# Altium footprint library LAN Transformer.PcbLib: 66 footprints (part 4 of 5)
Each footprint in its own frame and in the unit in brackets; x right, y up, seen from the top. Pads: shape width x height; smd on the part's side, far side on the other; paste and mask are expansions set on the pad; w line width, h text height; cw(c..) or ccw(c..) is an arc to the next point about the centre after c.
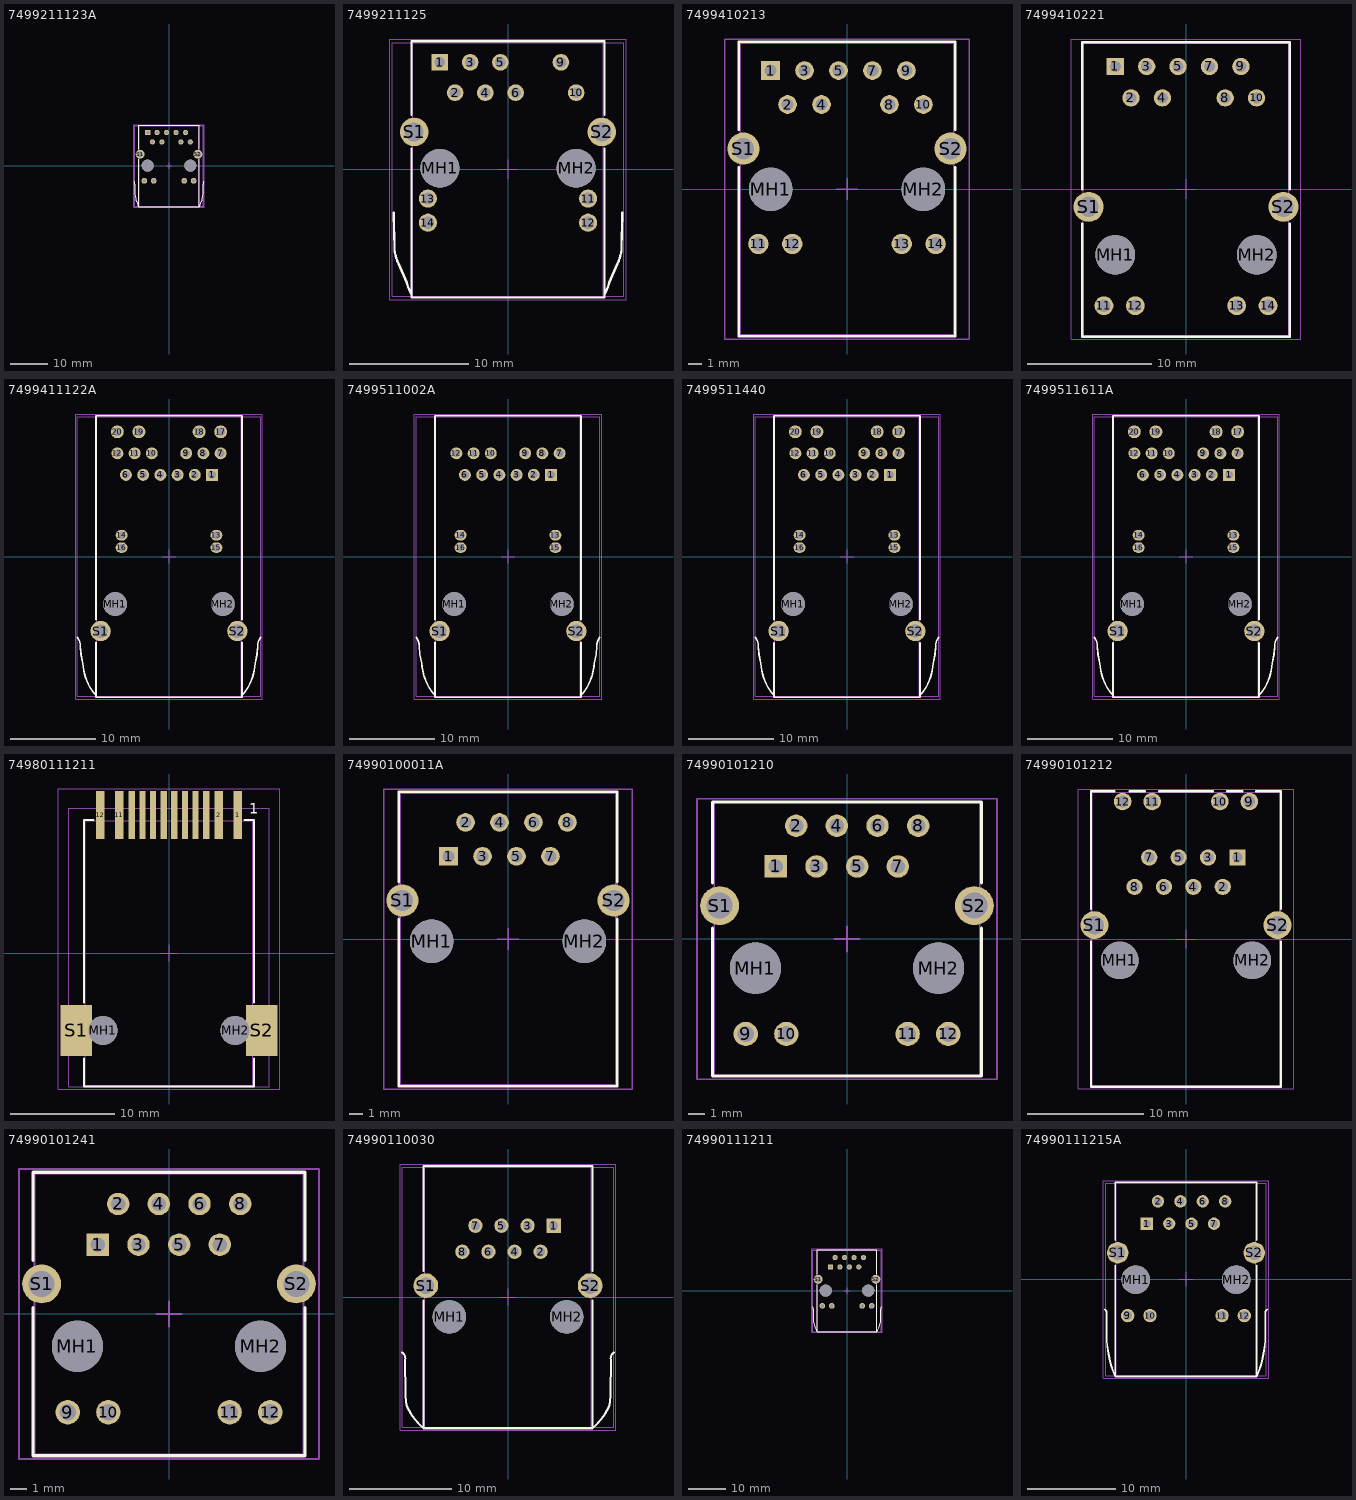
[diagram p3: the footprints below, top view; thin cyan lines are the x and y axes]

## 7499211123A [mm] "LAN Transformer, body 21.6x16mm"
height 13.95
pads (17):
  rect 1.4x1.4 hole 0.9: 1(-5.715,8.98)
  round 1.4 hole 0.9: 2(-4.445,6.44) 3(-3.175,8.98) 4(-1.905,6.44) 5(-0.635,8.98) 7(1.905,8.98) 8(3.175,6.44) 9(4.445,8.98) 10(5.715,6.44)
  round 1.52 hole 1.02: 11(-6.63,-3.97) 12(-4.09,-3.97) 13(4.09,-3.97) 14(6.63,-3.97)
  round 3.25 hole 3.25 unplated: MH1(-5.715,0.09) MH2(5.715,0.09)
  round 2.4 hole 1.6: S1(-7.745,3.14) S2(7.745,3.14)
Top Overlay:
  lines w0.2: -9.269,-4.203 cw(c-10.38,-4.815) -9.113,-4.872 ccw(c-5.498,-5.312) -9.14,-5.342 ccw(c15.524,-6.17) -9.069,-8.214 ccw(c-0.65,-6.695) -8.1,-10.9 ; -8.1,1.74 -8.1,-10.9 ; -8.1,4.55 -8.1,10.9 8.1,10.9 8.1,4.55 ; 8.1,1.74 8.1,-10.9 ; 9.269,-4.203 ccw(c10.38,-4.815) 9.113,-4.872 cw(c5.498,-5.312) 9.14,-5.342 cw(c-15.524,-6.17) 9.069,-8.214 cw(c0.65,-6.695) 8.1,-10.9 ; -8.1,-10.9 8.1,-10.9
Mechanical 11:
  lines w0.1: -8,-10.8 -8,10.8 8,10.8 8,-10.8 -8,-10.8
  text ".Designator" at 0,0 h1
Mechanical 13:
  lines w0.1: -9.223,-10.8 9.223,-10.8 9.223,10.8 -9.223,10.8 -9.223,-10.8
Mechanical 15:
  lines w0.1: -0.8,0 0.8,0 ; 0,-0.8 0,0.8 ; -9.47,-11.1 -9.47,11.1 9.47,11.1 9.47,-11.1 -9.47,-11.1
3D body "7499211123A.stp": height 15.27, standoff -3.6, extent -9.223,-10.8 9.223,10.8

## 7499211125 [mm] "LAN Transformer, body 21.3x16mm"
height 13.55
pads (16):
  rect 1.4x1.4 hole 0.89: 1(-5.715,8.99)
  round 1.4 hole 0.89: 2(-4.445,6.45) 3(-3.175,8.99) 4(-1.905,6.45) 5(-0.635,8.99) 6(0.635,6.45) 9(4.445,8.99) 10(5.715,6.45)
  round 1.52 hole 1.02: 11(6.725,-2.44) 12(6.725,-4.47) 13(-6.725,-2.44) 14(-6.725,-4.47)
  round 3.25 hole 3.25 unplated: MH1(-5.715,0.1) MH2(5.715,0.1)
  round 2.4 hole 1.6: S1(-7.875,3.15) S2(7.875,3.15)
Top Overlay:
  lines w0.2: -9.588,-3.63 -9.53,-6.73 ccw(c-8.26,-6.73) -9.43,-7.224 ccw(c-6.96,-6.73) -9.172,-7.935 -8.505,-9.494 ccw(c-2.16,-7.61) -8.1,-10.53 ; -8.1,1.73 -8.1,-10.75 8.1,-10.75 8.1,1.73 ; -8.1,4.57 -8.1,10.75 8.1,10.75 8.1,4.57 ; 8.1,-10.53 ccw(c2.16,-7.61) 8.505,-9.494 9.172,-7.935 ccw(c6.96,-6.73) 9.43,-7.224 ccw(c8.26,-6.73) 9.53,-6.73 9.588,-3.63
Mechanical 11:
  lines w0.1: -8,-10.65 -8,10.65 8,10.65 8,-10.65 -8,-10.65
  text ".Designator" at 0,0 h1
Mechanical 13:
  lines w0.1: -9.724,-10.65 9.724,-10.65 9.724,10.65 -9.724,10.65 -9.724,-10.65
Mechanical 15:
  lines w0.1: -0.8,0 0.8,0 ; 0,-0.8 0,0.8 ; -9.924,-10.95 -9.924,10.95 9.924,10.95 9.924,-10.95 -9.924,-10.95
3D body "7499211125.stp": height 15.3, standoff -3.35, extent -9.724,-10.65 9.724,10.65

## 7499410213 [mm] "LAN Transformer, body 21.84x16mm"
height 13.74
pads (17):
  rect 1.4x1.4 hole 0.9: 1(-5.715,8.86)
  round 1.4 hole 0.9: 2(-4.445,6.32) 3(-3.175,8.86) 4(-1.905,6.32) 5(-0.635,8.86) 7(1.905,8.86) 8(3.175,6.32) 9(4.445,8.86) 10(5.715,6.32)
  round 1.52 hole 1.02: 11(-6.63,-4.11) 12(-4.09,-4.11) 13(4.09,-4.11) 14(6.63,-4.11)
  round 3.25 hole 3.25 unplated: MH1(-5.715,-0.03) MH2(5.715,-0.03)
  round 2.4 hole 1.6: S1(-7.745,3.02) S2(7.745,3.02)
Top Overlay:
  lines w0.2: -8.1,1.61 -8.1,-11.02 8.1,-11.02 8.1,1.61 ; -8.1,4.43 -8.1,11.02 8.1,11.02 8.1,4.43
Mechanical 11:
  lines w0.1: -8,-10.92 -8,10.92 8,10.92 8,-10.92 -8,-10.92
  text ".Designator" at 0,0 h1
Mechanical 13:
  lines w0.1: -8,-10.92 8,-10.92 8,10.92 -8,10.92 -8,-10.92
Mechanical 15:
  lines w0.1: -0.8,0 0.8,0 ; 0,-0.8 0,0.8 ; -9.145,-11.22 -9.145,11.22 9.145,11.22 9.145,-11.22 -9.145,-11.22
3D body "7499410213.stp": height 13.92, standoff -3.25, extent -8,-10.92 8,10.92

## 7499410221 [mm] "LAN Transformer, body 23.6x16.6mm"
height 17.1
pads (17):
  rect 1.4x1.4 hole 0.89: 1(-5.72,9.91)
  round 1.4 hole 0.89: 2(-4.45,7.37) 3(-3.18,9.91) 4(-1.91,7.37) 5(-0.64,9.91) 7(1.9,9.91) 8(3.17,7.37) 9(4.44,9.91) 10(5.71,7.37)
  round 1.52 hole 1.02: 11(-6.635,-9.44) 12(-4.095,-9.44) 13(4.095,-9.44) 14(6.635,-9.44)
  round 3.2 hole 3.2 unplated: MH1(-5.715,-5.33) MH2(5.715,-5.33)
  round 2.43 hole 1.63: S1(-7.875,-1.44) S2(7.875,-1.44)
Top Overlay:
  lines w0.2: -8.4,-2.79 -8.4,-11.93 8.4,-11.93 8.4,-2.79 ; -8.4,-0.03 -8.4,11.87 8.4,11.87 8.4,-0.03
Mechanical 11:
  lines w0.1: -8.3,-11.83 8.3,-11.83 8.3,11.77 -8.3,11.77 -8.3,-11.83
  text ".Designator" at 0,0 h1
Mechanical 13:
  lines w0.1: -8.3,-11.83 -8.3,11.77 8.3,11.77 8.3,-11.83 -8.3,-11.83
Mechanical 15:
  lines w0.1: -0.8,0 0.8,0 ; 0,-0.8 0,0.8 ; -9.29,-12.13 9.29,-12.13 9.29,12.13 -9.29,12.13 -9.29,-12.13
3D body "7499410221.stp": height 17.65, standoff -2.25, extent -8.3,-11.83 8.3,11.77

## 7499411122A [mm] "LAN Transformer, body 33.02x17mm"
height 13.87
pads (24):
  rect 1.4x1.4 hole 0.9: 1(5.075,9.63)
  round 1.4 hole 0.9: 2(3.045,9.63) 3(1.015,9.63) 4(-1.015,9.63) 5(-3.045,9.63) 6(-5.075,9.63) 7(6.09,12.17) 8(4.06,12.17) 9(2.03,12.17) 10(-2.03,12.17) 11(-4.06,12.17) 12(-6.09,12.17)
  oval 1.4x1.25 hole 0.9: 13(5.59,2.51) 14(-5.59,2.51) 15(5.59,1.05) 16(-5.59,1.05)
  round 1.52 hole 1.02: 17(6.095,14.71) 18(3.555,14.71) 19(-3.555,14.71) 20(-6.095,14.71)
  round 2.8 hole 2.8 unplated: MH1(-6.35,-5.61) MH2(6.35,-5.61)
  round 2.4 hole 1.6: S1(-8.065,-8.79) S2(8.065,-8.79)
Top Overlay:
  lines w0.2: -10.82,-9.524 cw(c-12.205,-10.59) -10.46,-10.689 ; -10.457,-10.586 -10.381,-11.533 -10.167,-12.598 ccw(c-3.805,-12.2) -8.6,-16.4 ; -8.6,-10.15 -8.6,-16.61 8.6,-16.61 8.6,-10.15 ; -8.6,-7.43 -8.6,16.61 8.6,16.61 8.6,-7.43 ; 8.6,-16.4 ccw(c3.805,-12.2) 10.167,-12.598 10.381,-11.533 10.457,-10.586 ; 10.46,-10.689 cw(c12.205,-10.59) 10.82,-9.524
Mechanical 11:
  lines w0.1: -8.5,-16.51 8.5,-16.51 8.5,16.51 -8.5,16.51 -8.5,-16.51
  text ".Designator" at 0,0 h1
Mechanical 13:
  lines w0.1: -10.8,-16.51 -10.8,16.51 10.8,16.51 10.8,-16.51 -10.8,-16.51
Mechanical 15:
  lines w0.1: -0.8,0 0.8,0 ; 0,-0.8 0,0.8 ; -11.02,-16.81 11.02,-16.81 11.02,16.81 -11.02,16.81 -11.02,-16.81
3D body "7499411122A.stp": height 16.21, standoff -3.14, extent -10.8,-16.51 10.8,16.51

## 7499511002A [mm] "LAN Transformer, body 33.02x17.02mm"
height 13.87
pads (20):
  rect 1.4x1.4 hole 0.9: 1(5.075,9.63)
  round 1.4 hole 0.9: 2(3.045,9.63) 3(1.015,9.63) 4(-1.015,9.63) 5(-3.045,9.63) 6(-5.075,9.63) 7(6.09,12.17) 8(4.06,12.17) 9(2.03,12.17) 10(-2.03,12.17) 11(-4.06,12.17) 12(-6.09,12.17)
  oval 1.4x1.25 hole 0.9: 13(5.59,2.52) 14(-5.59,2.52) 15(5.59,1.05) 16(-5.59,1.05)
  round 2.8 hole 2.8 unplated: MH1(-6.35,-5.61) MH2(6.35,-5.61)
  round 2.4 hole 1.6: S1(-8.065,-8.79) S2(8.065,-8.79)
Top Overlay:
  lines w0.2: -10.83,-9.524 cw(c-12.215,-10.59) -10.47,-10.689 ; -10.467,-10.586 -10.391,-11.533 -10.177,-12.598 ccw(c-3.815,-12.2) -8.61,-16.4 ; -8.61,-10.15 -8.61,-16.61 8.61,-16.61 8.61,-10.15 ; -8.61,-7.43 -8.61,16.61 8.61,16.61 8.61,-7.43 ; 8.61,-16.4 ccw(c3.815,-12.2) 10.177,-12.598 10.391,-11.533 10.467,-10.586 ; 10.47,-10.689 cw(c12.215,-10.59) 10.83,-9.524
Mechanical 11:
  lines w0.1: -8.51,-16.51 8.51,-16.51 8.51,16.51 -8.51,16.51 -8.51,-16.51
  text ".Designator" at 0,0 h1
Mechanical 13:
  lines w0.1: -10.8,-16.51 -10.8,16.51 10.8,16.51 10.8,-16.51 -10.8,-16.51
Mechanical 15:
  lines w0.1: -0.8,0 0.8,0 ; 0,-0.8 0,0.8 ; -11.03,-16.81 -11.03,16.81 11.03,16.81 11.03,-16.81 -11.03,-16.81
3D body "7499511002A.stp": height 16.21, standoff -3.64, extent -10.81,-16.51 10.81,16.51

## 7499511440 [mm] "LAN Transformer, body 33.02x17mm"
height 13.87
pads (24):
  rect 1.4x1.4 hole 0.89: 1(5.075,9.63)
  round 1.4 hole 0.89: 2(3.045,9.63) 3(1.015,9.63) 4(-1.015,9.63) 5(-3.045,9.63) 6(-5.075,9.63) 7(6.09,12.17) 8(4.06,12.17) 9(2.03,12.17) 10(-2.03,12.17) 11(-4.06,12.17) 12(-6.09,12.17)
  oval 1.4x1.25 hole 0.89: 13(5.59,2.51) 14(-5.59,2.51) 15(5.59,1.05) 16(-5.59,1.05)
  round 1.52 hole 1.02: 17(6.095,14.71) 18(3.555,14.71) 19(-3.555,14.71) 20(-6.095,14.71)
  round 2.8 hole 2.8 unplated: MH1(-6.35,-5.61) MH2(6.35,-5.61)
  round 2.4 hole 1.57: S1(-8.065,-8.79) S2(8.065,-8.79)
Top Overlay:
  lines w0.2: -10.82,-9.524 cw(c-12.205,-10.59) -10.46,-10.689 ; -10.457,-10.586 -10.381,-11.533 -10.167,-12.598 ccw(c-3.805,-12.2) -8.6,-16.4 ; -8.6,-10.16 -8.6,-16.61 8.6,-16.61 8.6,-10.16 ; -8.6,-7.44 -8.6,16.61 8.6,16.61 8.6,-7.44 ; 8.6,-16.4 ccw(c3.805,-12.2) 10.167,-12.598 10.381,-11.533 10.457,-10.586 ; 10.46,-10.689 cw(c12.205,-10.59) 10.82,-9.524
Mechanical 11:
  lines w0.1: -8.5,-16.51 -8.5,16.51 8.5,16.51 8.5,-16.51 -8.5,-16.51
  text ".Designator" at 0,0 h1
Mechanical 13:
  lines w0.1: -10.8,-16.51 10.8,-16.51 10.8,16.51 -10.8,16.51 -10.8,-16.51
Mechanical 15:
  lines w0.1: -0.8,0 0.8,0 ; 0,-0.8 0,0.8 ; -11.02,-16.81 11.02,-16.81 11.02,16.81 -11.02,16.81 -11.02,-16.81
3D body "7499511440.stp": height 16.21, standoff -3.64, extent -10.8,-16.51 10.8,16.51

## 7499511611A [mm] "LAN Transformer, body 33.02x17mm"
height 13.87
pads (24):
  rect 1.4x1.4 hole 0.89: 1(5.075,9.63)
  round 1.4 hole 0.89: 2(3.045,9.63) 3(1.015,9.63) 4(-1.015,9.63) 5(-3.045,9.63) 6(-5.075,9.63) 7(6.09,12.17) 8(4.06,12.17) 9(2.03,12.17) 10(-2.03,12.17) 11(-4.06,12.17) 12(-6.09,12.17)
  oval 1.4x1.25 hole 0.89: 13(5.59,2.51) 14(-5.59,2.51) 15(5.59,1.05) 16(-5.59,1.05)
  round 1.52 hole 1.02: 17(6.095,14.71) 18(3.555,14.71) 19(-3.555,14.71) 20(-6.095,14.71)
  round 2.8 hole 2.8 unplated: MH1(-6.35,-5.61) MH2(6.35,-5.61)
  round 2.4 hole 1.57: S1(-8.065,-8.79) S2(8.065,-8.79)
Top Overlay:
  lines w0.2: -10.82,-9.524 cw(c-12.205,-10.59) -10.46,-10.689 ; -10.457,-10.586 -10.381,-11.533 -10.167,-12.598 ccw(c-3.805,-12.2) -8.6,-16.4 ; -8.6,-10.16 -8.6,-16.61 8.6,-16.61 8.6,-10.16 ; -8.6,-7.44 -8.6,16.61 8.6,16.61 8.6,-7.44 ; 8.6,-16.4 ccw(c3.805,-12.2) 10.167,-12.598 10.381,-11.533 10.457,-10.586 ; 10.46,-10.689 cw(c12.205,-10.59) 10.82,-9.524
Mechanical 11:
  lines w0.1: -8.5,-16.51 -8.5,16.51 8.5,16.51 8.5,-16.51 -8.5,-16.51
  text ".Designator" at 0,0 h1
Mechanical 13:
  lines w0.1: -10.8,-16.51 10.8,-16.51 10.8,16.51 -10.8,16.51 -10.8,-16.51
Mechanical 15:
  lines w0.1: -0.8,0 0.8,0 ; 0,-0.8 0,0.8 ; -11.02,-16.81 11.02,-16.81 11.02,16.81 -11.02,16.81 -11.02,-16.81
3D body "7499511611A.stp": height 16.21, standoff -3.26, extent -10.8,-16.51 10.8,16.51

## 74980111211 [mm] "LAN Transformer, body 25.4x16.1mm"
height 13.61
pads (16):
  rect 0.81x4.6 smd: 1(6.61,13.27) 2(4.77,13.27) 11(-4.77,13.27) 12(-6.61,13.27)
  rect 0.61x4.6 smd: 3(3.57,13.27) 4(2.55,13.27) 5(1.53,13.27) 6(0.51,13.27) 7(-0.51,13.27) 8(-1.53,13.27) 9(-2.55,13.27) 10(-3.57,13.27)
  round 2.8 hole 2.8 unplated: MH1(-6.35,-7.42) MH2(6.35,-7.42)
  rect 3x4.9 smd: S1(-8.92,-7.42) S2(8.92,-7.42)
Top Overlay:
  lines w0.2: -8.15,-10.1 -8.15,-12.8 8.15,-12.8 8.15,-10.1 ; -8.15,-4.75 -8.15,12.8 -7.25,12.8 ; 7.25,12.8 8.15,12.8 8.15,-4.75
  text "1" at 7.7,13.4 h1
Mechanical 11:
  lines w0.1: -8.05,-12.7 8.05,-12.7 8.05,12.7 -8.05,12.7 -8.05,-12.7
  text ".Designator" at 0,0 h1
Mechanical 13:
  lines w0.1: -9.65,-12.85 -9.65,13.9 9.65,13.9 9.65,-12.85 -9.65,-12.85
Mechanical 15:
  lines w0.1: -0.8,0 0.8,0 ; 0,-0.8 0,0.8 ; -10.62,-13.05 10.62,-13.05 10.62,15.77 -10.62,15.77 -10.62,-13.05
3D body "74980111211.stp": height 15.21, standoff -1, extent -9.65,-12.85 9.65,13.9

## 74990100011A [mm] "LAN Transformer, body 21.84x16.13mm"
height 13.74
pads (12):
  rect 1.4x1.4 hole 0.89: 1(-4.445,6.18)
  round 1.4 hole 0.89: 2(-3.175,8.72) 3(-1.905,6.18) 4(-0.635,8.72) 5(0.635,6.18) 6(1.905,8.72) 7(3.175,6.18) 8(4.445,8.72)
  round 3.25 hole 3.25 unplated: MH1(-5.715,-0.17) MH2(5.715,-0.17)
  round 2.4 hole 1.6: S1(-7.9,2.88) S2(7.9,2.88)
Top Overlay:
  lines w0.2: -8.165,1.46 -8.165,-11.02 8.165,-11.02 8.165,1.46 ; -8.165,4.3 -8.165,11.02 8.165,11.02 8.165,4.3
Mechanical 11:
  lines w0.1: -8.065,-10.92 8.065,-10.92 8.065,10.92 -8.065,10.92 -8.065,-10.92
  text ".Designator" at 0,0 h1
Mechanical 13:
  lines w0.1: -8.165,-10.92 -8.165,10.92 8.165,10.92 8.165,-10.92 -8.165,-10.92
Mechanical 15:
  lines w0.1: -0.8,0 0.8,0 ; 0,-0.8 0,0.8 ; -9.3,-11.22 9.3,-11.22 9.3,11.22 -9.3,11.22 -9.3,-11.22
3D body "74990100011A.stp": height 13.78, standoff -3.01, extent -8.165,-10.92 8.165,10.92

## 74990101210 [mm] "LAN Transformer, THT, body 17.1x16.6mm"
height 17.5
pads (16):
  rect 1.4x1.4 hole 0.89: 1(-4.445,4.53)
  round 1.4 hole 0.89: 2(-3.175,7.07) 3(-1.905,4.53) 4(-0.635,7.07) 5(0.635,4.53) 6(1.905,7.07) 7(3.175,4.53) 8(4.445,7.07)
  round 1.52 hole 1.02: 9(-6.325,-5.93) 10(-3.785,-5.93) 11(3.785,-5.93) 12(6.325,-5.93)
  round 3.2 hole 3.2 unplated: MH1(-5.715,-1.82) MH2(5.715,-1.82)
  round 2.43 hole 1.63: S1(-7.95,2.08) S2(7.95,2.08)
Top Overlay:
  lines w0.2: -8.4,0.67 -8.4,-8.55 8.4,-8.55 8.4,0.67 ; -8.4,3.49 -8.4,8.55 8.4,8.55 8.4,3.49
Mechanical 11:
  lines w0.1: -8.3,-8.55 8.3,-8.55 8.3,8.55 -8.3,8.55 -8.3,-8.55
  text ".Designator" at -0.5,-0.5 h1
Mechanical 13:
  lines w0.1: -8.3,-8.55 -8.3,8.55 8.3,8.55 8.3,-8.55 -8.3,-8.55
Mechanical 15:
  lines w0.1: -0.8,0 0.8,0 ; 0,-0.8 0,0.8 ; -9.365,-8.75 -9.365,8.75 9.365,8.75 9.365,-8.75 -9.365,-8.75
3D body "74990101210.stp": height 17.1, standoff -3.5, extent -8.3,-8.55 8.3,8.35

## 74990101212 [mm] "LAN Transformer, body 25.3x16.2mm"
height 13.5
pads (16):
  rect 1.4x1.4 hole 0.9: 1(4.445,7.04)
  round 1.4 hole 0.9: 2(3.175,4.5) 3(1.905,7.04) 4(0.635,4.5) 5(-0.635,7.04) 6(-1.905,4.5) 7(-3.175,7.04) 8(-4.445,4.5)
  round 1.52 hole 1.02: 9(5.465,11.87) 10(2.925,11.87) 11(-2.925,11.87) 12(-5.465,11.87)
  round 3.25 hole 3.25 unplated: MH1(-5.715,-1.85) MH2(5.715,-1.85)
  round 2.4 hole 1.6: S1(-7.9,1.2) S2(7.9,1.2)
Top Overlay:
  lines w0.2: -8.2,-0.23 -8.2,-12.75 8.2,-12.75 8.2,-0.23 ; -8.2,2.61 -8.2,12.75 -6.18,12.75 ; -4.86,12.75 -3.54,12.75 ; -2.32,12.75 2.32,12.75 ; 3.54,12.75 4.86,12.75 ; 6.06,12.75 8.2,12.75 8.2,2.61
Mechanical 11:
  lines w0.1: -8.1,-12.65 8.1,-12.65 8.1,12.65 -8.1,12.65 -8.1,-12.65
  text ".Designator" at 0,0 h1
Mechanical 13:
  lines w0.1: -8.2,-12.65 8.2,-12.65 8.2,12.65 -8.2,12.65 -8.2,-12.65
Mechanical 15:
  lines w0.1: -0.8,0 0.8,0 ; 0,-0.8 0,0.8 ; -9.3,-12.95 -9.3,12.95 9.3,12.95 9.3,-12.95 -9.3,-12.95
3D body "74990101212.stp": height 13.61, standoff -3.79, extent -8.2,-12.65 8.2,12.65

## 74990101241 [mm] "LAN Transformer, body 17.5x16.8mm"
height 17.5
pads (16):
  rect 1.4x1.4 hole 0.89: 1(-4.445,4.33)
  round 1.4 hole 0.89: 2(-3.175,6.87) 3(-1.905,4.33) 4(-0.635,6.87) 5(0.635,4.33) 6(1.905,6.87) 7(3.175,4.33) 8(4.445,6.87)
  round 1.52 hole 1.02: 9(-6.325,-6.13) 10(-3.785,-6.13) 11(3.785,-6.13) 12(6.325,-6.13)
  round 3.2 hole 3.2 unplated: MH1(-5.715,-2.02) MH2(5.715,-2.02)
  round 2.43 hole 1.63: S1(-7.95,1.88) S2(7.95,1.88)
Top Overlay:
  lines w0.2: -8.5,0.41 -8.5,-8.85 8.5,-8.85 8.5,0.41 ; -8.5,3.35 -8.5,8.85 8.5,8.85 8.5,3.35
Mechanical 11:
  lines w0.1: -8.4,-8.75 8.4,-8.75 8.4,8.75 -8.4,8.75 -8.4,-8.75
  text ".Designator" at -0.5,-0.5 h1
Mechanical 13:
  lines w0.1: -8.4,-8.75 -8.4,8.75 8.4,8.75 8.4,-8.75 -8.4,-8.75
Mechanical 15:
  lines w0.1: -0.8,0 0.8,0 ; 0,-0.8 0,0.8 ; -9.365,-9.05 9.365,-9.05 9.365,9.05 -9.365,9.05 -9.365,-9.05
3D body "74990101241.stp": height 17.05, standoff -3.55, extent -8.3,-8.75 8.3,8.15

## 74990110030 [mm] "LAN Transformer, body 25.35x16.25mm"
height 13.5
pads (12):
  rect 1.4x1.4 hole 0.9: 1(4.445,6.965)
  round 1.4 hole 0.9: 2(3.175,4.425) 3(1.905,6.965) 4(0.635,4.425) 5(-0.635,6.965) 6(-1.905,4.425) 7(-3.175,6.965) 8(-4.445,4.425)
  round 3.25 hole 3.25 unplated: MH1(-5.715,-1.925) MH2(5.715,-1.925)
  round 2.4 hole 1.6: S1(-8,1.125) S2(8,1.125)
Top Overlay:
  lines w0.2: -10.31,-5.393 cw(c-10.731,-5.979) -10.017,-6.08 -9.979,-9.48 ccw(c-3.1,-9.38) -9.953,-9.98 ccw(c-7.9,-9.98) -9.828,-10.685 ccw(c-4.4,-8.18) -8.225,-12.775 ; -8.225,-0.305 -8.225,-12.775 ; -8.225,2.555 -8.225,12.775 8.225,12.775 8.225,2.555 ; 8.225,-0.305 8.225,-12.775 ; 10.31,-5.393 ccw(c10.731,-5.979) 10.017,-6.08 9.979,-9.48 cw(c3.1,-9.38) 9.953,-9.98 cw(c7.9,-9.98) 9.828,-10.685 cw(c4.4,-8.18) 8.225,-12.775 ; -8.225,-12.775 8.225,-12.775
Mechanical 11:
  lines w0.1: -8.125,-12.675 -8.125,12.675 8.125,12.675 8.125,-12.675 -8.125,-12.675
  text ".Designator" at 0,0 h1
Mechanical 13:
  lines w0.1: -10.298,-12.675 10.298,-12.675 10.298,12.675 -10.298,12.675 -10.298,-12.675
Mechanical 15:
  lines w0.1: -0.8,0 0.8,0 ; 0,-0.8 0,0.8 ; -10.5,-12.975 -10.5,12.975 10.5,12.975 10.5,-12.975 -10.5,-12.975
3D body "74990110030.stp": height 15.78, standoff -3.33, extent -10.298,-12.675 10.298,12.675

## 74990111211 [mm] "LAN Transfomer, body 21.84x15.88mm"
height 13.95
pads (16):
  rect 1.4x1.4 hole 0.89: 1(-4.45,6.32)
  round 1.4 hole 0.89: 2(-3.18,8.86) 3(-1.91,6.32) 4(-0.64,8.86) 5(0.63,6.32) 6(1.9,8.86) 7(3.17,6.32) 8(4.44,8.86)
  round 1.52 hole 1.02: 9(-6.625,-4.11) 10(-4.085,-4.11) 11(4.085,-4.11) 12(6.625,-4.11)
  round 3.25 hole 3.25 unplated: MH1(-5.715,-0.03) MH2(5.715,-0.03)
  round 2.4 hole 1.63: S1(-7.745,3.02) S2(7.745,3.02)
Top Overlay:
  lines w0.2: -9.209,-4.323 cw(c-10.32,-4.935) -9.053,-4.992 ccw(c-5.438,-5.432) -9.08,-5.462 ccw(c15.584,-6.29) -9.009,-8.334 ccw(c-0.59,-6.815) -8.04,-11.02 ; -8.04,1.6 -8.04,-11.02 ; -8.04,4.44 -8.04,11.02 8.04,11.02 8.04,4.44 ; 8.04,1.6 8.04,-11.02 ; 9.209,-4.323 ccw(c10.32,-4.935) 9.053,-4.992 cw(c5.438,-5.432) 9.08,-5.462 cw(c-15.584,-6.29) 9.009,-8.334 cw(c0.59,-6.815) 8.04,-11.02 ; -8.04,-11.02 8.04,-11.02
Mechanical 11:
  lines w0.1: -7.94,-10.92 7.94,-10.92 7.94,10.92 -7.94,10.92 -7.94,-10.92
  text ".Designator" at 0,0 h1
Mechanical 13:
  lines w0.1: -9.163,-11 -9.163,10.86 9.163,10.86 9.163,-11 -9.163,-11
Mechanical 15:
  lines w0.1: -0.8,0 0.8,0 ; 0,-0.8 0,0.8 ; -9.4,-11.22 -9.4,11.22 9.4,11.22 9.4,-11.22 -9.4,-11.22
3D body "74990111211.stp": height 14.85, standoff -3.33, extent -9.163,-10.98 9.163,10.86

## 74990111215A [mm] "LAN Transformer, body 21.84x15.88mm"
height 13.74
pads (16):
  rect 1.4x1.4 hole 0.89: 1(-4.445,6.32)
  round 1.4 hole 0.89: 2(-3.175,8.86) 3(-1.905,6.32) 4(-0.635,8.86) 5(0.635,6.32) 6(1.905,8.86) 7(3.175,6.32) 8(4.445,8.86)
  round 1.52 hole 1.02: 9(-6.625,-4.11) 10(-4.085,-4.11) 11(4.085,-4.11) 12(6.625,-4.11)
  round 3.25 hole 3.25 unplated: MH1(-5.715,-0.03) MH2(5.715,-0.03)
  round 2.43 hole 1.63: S1(-7.745,3.02) S2(7.745,3.02)
Top Overlay:
  lines w0.2: -9.212,-3.428 cw(c-9.35,-3.75) -8.999,-3.75 -9.005,-6.951 ; -8.998,-6.9 ccw(c4,-6.05) -8.04,-11.02 ; -8.04,1.58 -8.04,-11.02 ; -8.04,4.46 -8.04,11.02 8.04,11.02 8.04,4.46 ; 8.04,1.58 8.04,-11.02 ; 8.998,-6.9 cw(c-4,-6.05) 8.04,-11.02 ; 9.005,-6.951 8.999,-3.75 cw(c9.35,-3.75) 9.212,-3.428 ; -8.04,-11.02 8.04,-11.02
Mechanical 11:
  lines w0.1: -7.94,-10.92 7.94,-10.92 7.94,10.92 -7.94,10.92 -7.94,-10.92
  text ".Designator" at 0,0 h1
Mechanical 13:
  lines w0.1: -9.111,-10.92 -9.111,10.92 9.111,10.92 9.111,-10.92 -9.111,-10.92
Mechanical 15:
  lines w0.1: -0.8,0 0.8,0 ; 0,-0.8 0,0.8 ; -9.412,-11.22 9.412,-11.22 9.412,11.22 -9.412,11.22 -9.412,-11.22
3D body "74990111215A.stp": height 15.41, standoff -3.43, extent -9.111,-10.92 9.111,10.92